# Altium footprint library Connector.PcbLib: 65 footprints (part 3 of 5)
Each footprint in its own frame and in the unit in brackets; x right, y up, seen from the top. Pads: shape width x height; smd on the part's side, far side on the other; paste and mask are expansions set on the pad; w line width, h text height; cw(c..) or ccw(c..) is an arc to the next point about the centre after c.
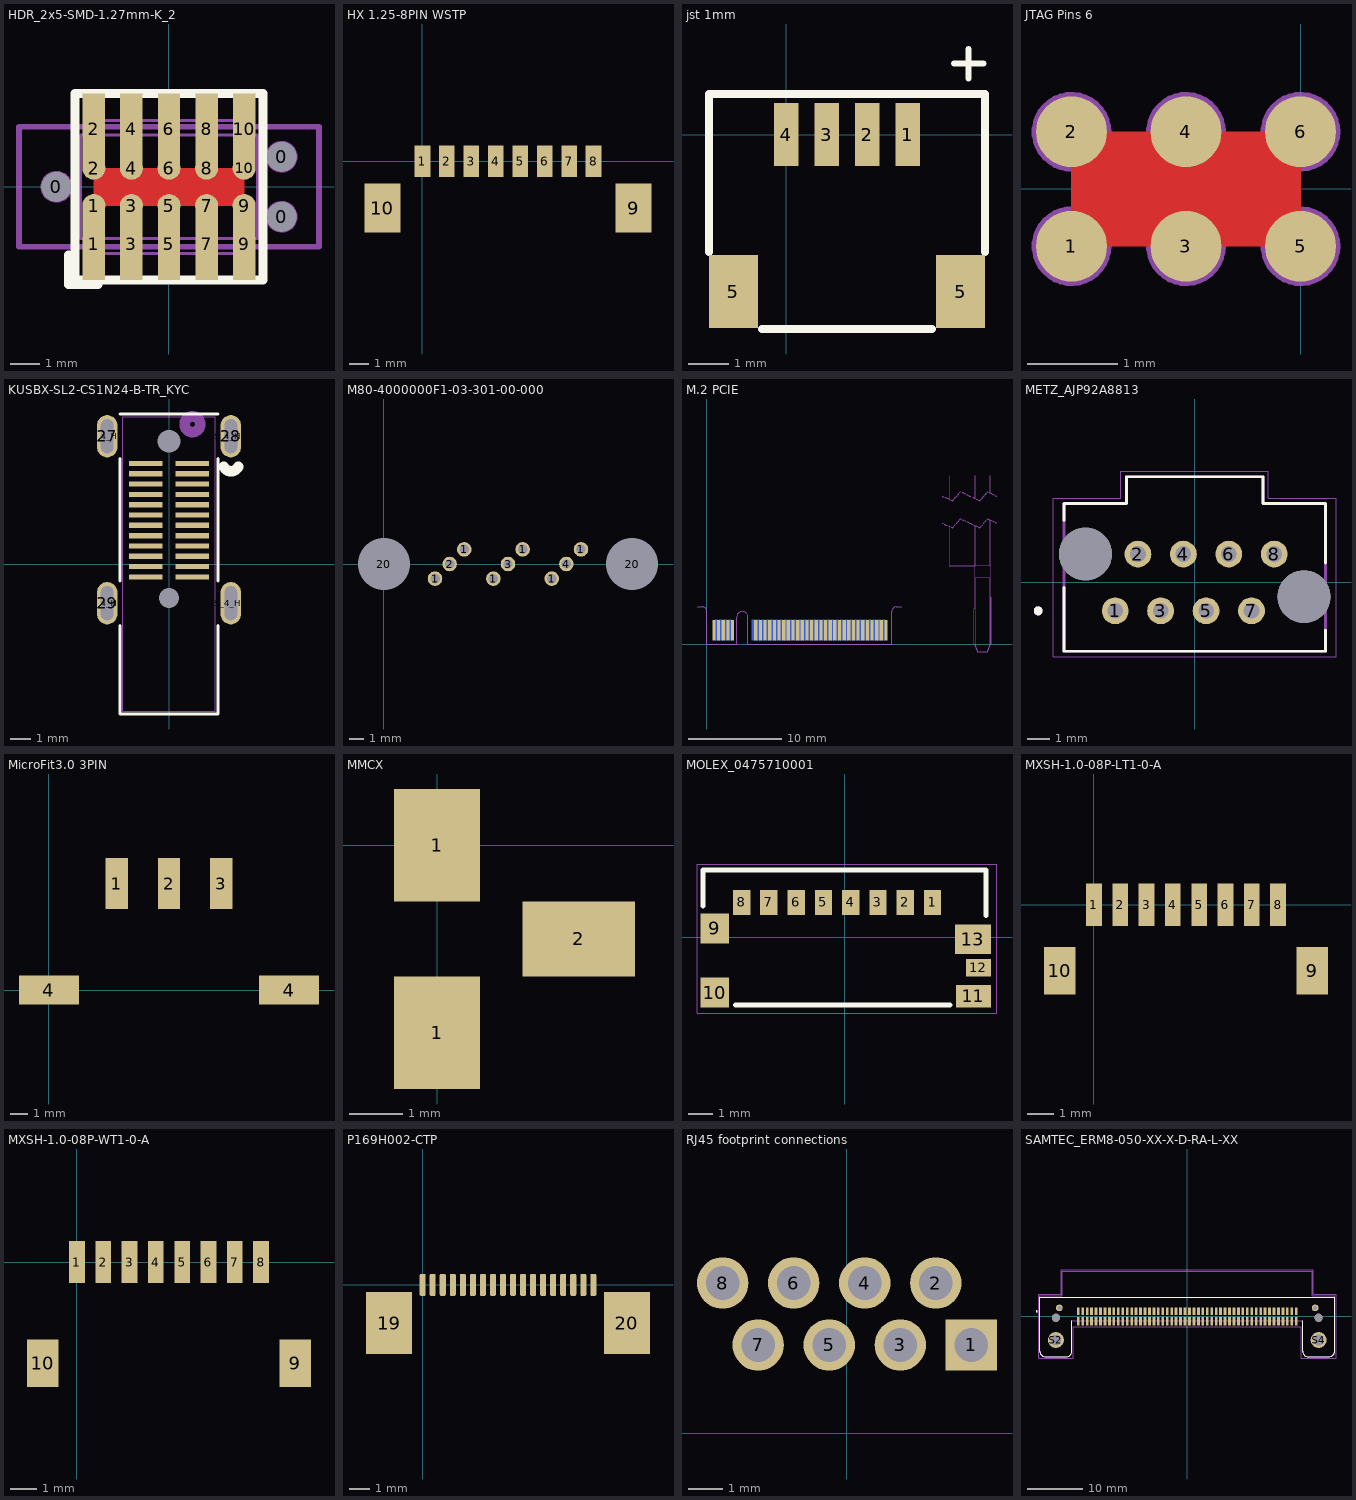
[diagram p2: the footprints below, top view; thin cyan lines are the x and y axes]

## HDR_2x5-SMD-1.27mm-K_2 [mil]
pads (23):
  round 39 hole 39 unplated: 0(-150,0) 0(150,-40) 0(150,40)
  rect 29.92x94.49 smd: 1(-100,-76.77) 2(-100,76.77) 3(-50,-76.77) 4(-50,76.77) 5(0,-76.77) 6(0,76.77) 7(50,-76.77) 8(50,76.77) 9(100,-76.77) 10(100,76.77)
  round 31 smd paste-196.85: 1(-100,-25) 2(-100,25) 3(-50,-25) 4(-50,25) 5(0,-25) 6(0,25) 7(50,-25) 8(50,25) 9(100,-25) 10(100,25)
Top Layer:
  pour cut-out: -100,25 -100,-25 100,-25 100,25
Top Overlay:
  lines w11.81: -133.86,-90.55 -133.86,-129.92 -94.49,-129.92 ; -125,-124.02 125,-124.02 125,124.02 -125,124.02 -125,-124.02
Mechanical 7:
  lines w3.94: -107.87,-68.9 -107.87,-96.79 ccw(c-100,-96.79) -92.13,-96.79 -92.13,-88.58 ; -107.87,68.9 -107.87,96.79 cw(c-100,96.79) -92.13,96.79 -92.13,88.58 ; -98.43,-68.9 -98.43,-88.58 -49.21,-88.58 ; -98.43,68.9 -98.43,88.58 98.43,88.58 98.43,68.9 ; -57.87,-88.58 -57.87,-96.79 ccw(c-50,-96.79) -42.13,-96.79 -42.13,-88.58 ; -57.87,88.58 -57.87,96.79 cw(c-50,96.79) -42.13,96.79 -42.13,88.58 ; -49.21,-68.9 -49.21,-88.58 ; -7.87,-88.58 -7.87,-96.79 ccw(c0,-96.79) 7.87,-96.79 7.87,-88.58 ; -7.87,88.58 -7.87,96.79 cw(c0,96.79) 7.87,96.79 7.87,88.58 ; 42.13,-88.58 42.13,-96.79 ccw(c50,-96.79) 57.87,-96.79 57.87,-88.58 ; 42.13,88.58 42.13,96.79 cw(c50,96.79) 57.87,96.79 57.87,88.58 ; 49.21,-68.9 49.21,-88.58 ; 92.13,-88.58 92.13,-96.79 ccw(c100,-96.79) 107.87,-96.79 107.87,-68.9 ; 92.13,88.58 92.13,96.79 cw(c100,96.79) 107.87,96.79 107.87,68.9 ; 98.43,-68.9 98.43,-88.58 49.21,-88.58 ; -49.21,-88.58 49.21,-88.58 ; -118.11,-68.9 -118.11,68.9 118.11,68.9 118.11,-68.9 -118.11,-68.9 ; -108.27,-32.87 -108.27,-17.13 -92.52,-17.13 -92.52,-32.87 -108.27,-32.87 ; -107.48,17.13 -107.48,32.87 -91.73,32.87 -91.73,17.13 -107.48,17.13 ; -58.27,-32.87 -58.27,-17.13 -42.52,-17.13 -42.52,-32.87 -58.27,-32.87 ; -57.48,17.13 -57.48,32.87 -41.73,32.87 -41.73,17.13 -57.48,17.13 ; -8.27,-32.87 -8.27,-17.13 7.48,-17.13 7.48,-32.87 -8.27,-32.87 ; -7.48,17.13 -7.48,32.87 8.27,32.87 8.27,17.13 -7.48,17.13 ; 41.73,-32.87 41.73,-17.13 57.48,-17.13 57.48,-32.87 41.73,-32.87 ; 42.52,17.13 42.52,32.87 58.27,32.87 58.27,17.13 42.52,17.13 ; 91.73,-32.87 91.73,-17.13 107.48,-17.13 107.48,-32.87 91.73,-32.87 ; 92.52,17.13 92.52,32.87 108.27,32.87 108.27,17.13 92.52,17.13
Mechanical 8:
  circle w3.94: c150,-39.98 r19.26
  circle w3.94: c150,39.98 r19.26
  circle w3.94: c-150,0 r19.26
Mechanical 15:
  lines w7.87: -199.8,-79.92 199.8,-79.92 199.8,79.92 -199.8,79.92 -199.8,-79.92
3D body "Samtec-FTSH-105-01-F-DV-K.step": height 240.75, standoff -0.25, extent -123.49,-114.99 123.51,115

## HX 1.25-8PIN WSTP [mm] "https://www.lcsc.com/product-detail/Wire-To-Board-Connector_hanxia-HX-1-25-8PIN-WSTP_C19270006.html?s_z=n_jst%208pin"
pads (10):
  rect 0.8x1.6 smd: 1(0,0) 2(1.25,0) 3(2.5,0) 4(3.75,0) 5(5,0) 6(6.25,0) 7(7.5,0) 8(8.75,0)
  rect 1.85x2.5 smd: 9(10.8,-2.4) 10(-2.05,-2.4)
3D body: height 3.55, standoff 0, extent -3.1,-5.25 11.9,0.75

## jst 1mm [mm]
pads (6):
  rect 0.6x1.55 smd: 1(3,0) 2(2,0) 3(1,0) 4(0,0)
  rect 1.2x1.8 smd: 5(-1.3,-3.875) 5(4.3,-3.875)
Top Overlay:
  lines w0.15: 4.135,1.75 4.865,1.75 ; 4.5,1.385 4.5,2.115
  lines w0.2: -1.9,-2.9 -1.9,1 4.9,1 4.9,-2.9 ; -0.6,-4.8 3.6,-4.8
3D body "SM04B-SRSS-TB.STEP": height 2.96, standoff 0, extent -1.476,-4.657 4.524,0.293

## JTAG Pins 6 [mil] "TC2030-ALT-NL"
pads (6):
  round 31 smd paste-196.85: 1(-100,-25) 2(-100,25) 3(-50,-25) 4(-50,25) 5(0,-25) 6(0,25)
Top Layer:
  pour cut-out: -100,25 -100,-25 0,-25 0,25
Mechanical 7:
  circle w3.94: c-100,24.99 r15.45
  circle w3.94: c-100,-24.99 r15.45
  circle w3.94: c-50,-24.99 r15.45
  circle w3.94: c0,-24.99 r15.45
  circle w3.94: c0,24.99 r15.45
  circle w3.94: c-50,24.99 r15.45
  text ".Designator" at -118.11,0 h15

## KUSBX-SL2-CS1N24-B-TR_KYC [mil]
pads (33):
  round 0 hole 43 unplated: 25(0,234.26)
  round 0 hole 39 unplated paste-99999 mask-19.5: 26(0,-64.96)
  oval 39x81 smd paste-40.5 mask-40.5: 27(-118.11,244.1) 28(118.11,244.1) 29(-118.11,-74.8)
  rect 64x10 smd paste+0 mask+0: A1(44.78,191.93) A2(44.78,172.25) A3(44.78,152.56) A4(44.78,132.88) A5(44.78,113.19) A6(44.78,93.51) A7(44.78,73.82) A8(44.78,54.14) A9(44.78,34.45) A10(44.78,14.77) A11(44.78,-4.92) A12(44.78,-24.6) B1(-44.78,-24.6) B2(-44.78,-4.92) B3(-44.78,14.77) B4(-44.78,34.45) B5(-44.78,54.14) B6(-44.78,73.82) B7(-44.78,93.51) B8(-44.78,113.19) B9(-44.78,132.88) B10(-44.78,152.56) B11(-44.78,172.25) B12(-44.78,191.93)
  oval 39.02x80.98 hole 24.02 slot 65 at 90 deg unplated: S_4_H1(-118.11,244.1) S_4_H1(-118.11,-74.8) S_4_H1(118.11,-74.8) S_4_H1(118.11,244.1)
Top Overlay:
  lines w6: -93.5,-117.18 -93.5,-286.5 93.5,-286.5 93.5,-117.18 ; -93.5,-32.42 -93.5,201.72 ; -93.5,286.5 93.5,286.5 ; 93.5,-32.42 93.5,201.72
  lines w20: 104.81,185.8 ccw(c118.5,191.93) 132.34,186.14
Bottom Overlay:
  lines w20: 105.16,185.08 ccw(c118.5,191.93) 132.33,186.12
Mechanical 13:
  circle w20: c44.78,266.93 r15
  lines w1: -88.5,-281.5 -88.5,281.5 88.5,281.5 88.5,-281.5 -88.5,-281.5
Multi-Layer:
  lines w24: 118.11,-95.3 118.11,-54.3
3D body "KUSBX-SL2-CS1N24-B_A (1).STEP": height 386.61, standoff -67.32, extent -124.12,-281.92 123.91,281.07

## M80-4000000F1-03-301-00-000 [mm] "Datamate harwin coax 3"
pads (11):
  round 1 hole 0.65: 1(3.5,-1) 1(5.5,1) 1(7.5,-1) 1(9.5,1) 1(11.5,-1) 1(13.5,1) 2(4.5,0) 3(8.5,0) 4(12.5,0)
  round 1.2 hole 3.55 unplated: 20(0,0) 20(17,0)
3D body "m80-4000000f1-03-301-00-000_asm.stp": height 5.5, standoff -3, extent -2.5,-2.775 19.5,2.775

## M.2 PCIE [mm]
pads (67):
  rect 0.35x2.2 smd paste-2539.97 mask-0.305: 1(19.25,1.5) 3(18.75,1.5) 5(18.25,1.5) 7(17.75,1.5) 9(17.25,1.5) 11(16.75,1.5) 13(16.25,1.5) 15(15.75,1.5) 17(15.25,1.5) 19(14.75,1.5) 21(14.25,1.5) 23(13.75,1.5) 25(13.25,1.5) 27(12.75,1.5) 29(12.25,1.5) 31(11.75,1.5) 33(11.25,1.5) 35(10.75,1.5) 37(10.25,1.5) 39(9.75,1.5) 41(9.25,1.5) 43(8.75,1.5) 45(8.25,1.5) 47(7.75,1.5) 49(7.25,1.5) 51(6.75,1.5) 53(6.25,1.5) 55(5.75,1.5) 57(5.25,1.5) 67(2.75,1.5) 69(2.25,1.5) 71(1.75,1.5) 73(1.25,1.5) 75(0.75,1.5)
  rect 0.35x2.2 smd far side paste-2539.97 mask-0.305: 2(19,1.5) 4(18.5,1.5) 6(18,1.5) 8(17.5,1.5) 10(17,1.5) 12(16.5,1.5) 14(16,1.5) 16(15.5,1.5) 18(15,1.5) 20(14.5,1.5) 22(14,1.5) 24(13.5,1.5) 26(13,1.5) 28(12.5,1.5) 30(12,1.5) 32(11.5,1.5) 34(11,1.5) 36(10.5,1.5) 38(10,1.5) 40(9.5,1.5) 42(9,1.5) 44(8.5,1.5) 46(8,1.5) 48(7.5,1.5) 50(7,1.5) 52(6.5,1.5) 54(6,1.5) 56(5.5,1.5) 58(5,1.5) 68(2.5,1.5) 70(2,1.5) 72(1.5,1.5) 74(1,1.5)
Top Solder:
  rectangle: 0,0 20,4
Bottom Solder:
  rectangle: 0,0 20,4
Mechanical 1:
  drawing of 115 lines, arcs and shapes, not listed
  text "Chamfer edge" at 31.8,1.133 h1

## METZ_AJP92A8813 [mm]
height 11
pads (10):
  round 1.2 hole 0.7: 1(-3.556,-1.27) 2(-2.54,1.27) 3(-1.524,-1.27) 4(-0.508,1.27) 5(0.508,-1.27) 6(1.524,1.27) 7(2.54,-1.27) 8(3.556,1.27)
  round 2.36 hole 2.36 unplated: ""(-4.89,1.27) ""(4.89,-0.635)
Top Overlay:
  circle w0.2: c-7,-1.27 r0.1
  lines w0.127: -5.85,-0.23 -5.85,-3.075 5.85,-3.075 5.85,-2.135 ; -5.85,2.77 -5.85,3.525 -3.05,3.525 -3.05,4.725 3.05,4.725 3.05,3.525 5.85,3.525 5.85,0.865
Mechanical 13:
  circle w0.2: c-7,-1.27 r0.1
  lines w0.127: -5.85,-3.075 -5.85,3.525 -3.05,3.525 -3.05,4.725 3.05,4.725 3.05,3.525 5.85,3.525 5.85,-3.075 -5.85,-3.075
Mechanical 15:
  lines w0.05: -6.32,-3.325 -6.32,3.775 -3.3,3.775 -3.3,4.975 3.3,4.975 3.3,3.775 6.32,3.775 6.32,-3.325 -6.32,-3.325
3D body "step_temp.STEP": height 11, standoff -3.3, extent -5.85,-3.075 5.85,4.725

## MicroFit3.0 3PIN [mm]
pads (5):
  rect 1.27x2.92 smd: 1(3.885,6.105) 2(6.885,6.105) 3(9.885,6.105)
  rect 3.43x1.65 smd: 4(0,0) 4(13.77,0)
3D body "436500314.stp": height 5.64, standoff -0.04, extent -1.525,-4.65 15.125,6.09

## MMCX [mm]
pads (3):
  rect 1.6x2.1 smd: 1(0,-3.5) 1(0,0)
  rect 2.1x1.4 smd: 2(2.65,-1.75)
3D body "HUBER+SUHNER 85_MMCX-S50-0-55119_OM 3DModel.stp": height 4.9, standoff 0, extent -1.835,-4.191 3.175,0.709

## MOLEX_0475710001 [mm]
pads (13):
  rect 0.7x1 smd: 1(3.55,1.415) 2(2.45,1.415) 3(1.35,1.415) 4(0.25,1.415) 5(-0.85,1.415) 6(-1.95,1.415) 7(-3.05,1.415) 8(-4.15,1.415)
  rect 1.15x1.2 smd: 9(-5.225,0.365) 10(-5.225,-2.225)
  rect 1.4x0.9 smd: 11(5.2,-2.375)
  rect 1x0.7 smd: 12(5.4,-1.225)
  rect 1.45x1.2 smd: 13(5.175,-0.075)
Top Overlay:
  lines w0.2: -5.7,1.275 -5.7,2.725 5.7,2.725 5.7,0.875 ; -4.4,-2.725 4.25,-2.725
Mechanical 16:
  lines w0.05: -5.95,-3.05 6.15,-3.05 6.15,2.95 -5.95,2.95 -5.95,-3.05
3D body "475710001.stp": height 2.31, standoff 0.01, extent -5.685,-2.598 5.715,2.852

## MXSH-1.0-08P-LT1-0-A [mm] "1mm 8 pin Vertical connector"
pads (10):
  rect 0.6x1.6 smd: 1(0,0) 2(1,0) 3(2,0) 4(3,0) 5(4,0) 6(5,0) 7(6,0) 8(7,0)
  rect 1.2x1.8 smd: 9(8.3,-2.5) 10(-1.3,-2.5)
3D body: height 4.5, standoff 0, extent -1.625,-3.3 8.625,-0.2

## MXSH-1.0-08P-WT1-0-A [mm] "1mm 8 pin horisontal connector"
pads (10):
  rect 0.6x1.6 smd: 1(0,0) 2(1,0) 3(2,0) 4(3,0) 5(4,0) 6(5,0) 7(6,0) 8(7,0)
  rect 1.2x1.8 smd: 9(8.3,-3.85) 10(-1.3,-3.85)
3D body: height 3, standoff 0, extent -1.566,-4.744 8.684,0.306

## P169H002-CTP [mm] "FPC Connector and display"
pads (20):
  rrect50% 0.3x1.1 smd: 1(8.5,0) 2(8,0) 3(7.5,0) 4(7,0) 5(6.5,0) 6(6,0) 7(5.5,0) 8(5,0) 9(4.5,0) 10(4,0) 11(3.5,0) 12(3,0) 13(2.5,0) 14(2,0) 15(1.5,0) 16(1,0) 17(0.5,0) 18(0,0)
  rect 2.3x3.1 smd: 19(-1.67,-1.9) 20(10.17,-1.9)
3D body "PRD-300-00002 - 3D Bent.STEP": height 5.91, standoff 1.32, extent -12.375,-24.899 20.875,16.349
3D body "c-1-1734839-8-c-3d.stp": height 2.2, standoff 0.15, extent -2.965,-4.86 11.465,0.25

## RJ45 footprint connections [mm]
pads (8):
  rect 1.478x1.478 hole 0.97: 1(3.58,2.54)
  round 1.478 hole 0.97: 2(2.56,4.32) 3(1.54,2.54) 4(0.52,4.32) 5(-0.5,2.54) 6(-1.52,4.32) 7(-2.54,2.54) 8(-3.56,4.32)

## SAMTEC_ERM8-050-XX-X-D-RA-L-XX [mm]
pads (106):
  rect 0.5x1.3 smd: 01(-19.6,0.84) 03(-18.8,0.84) 05(-18,0.84) 07(-17.2,0.84) 09(-16.4,0.84) 11(-15.6,0.84) 13(-14.8,0.84) 15(-14,0.84) 17(-13.2,0.84) 19(-12.4,0.84) 21(-11.6,0.84) 23(-10.8,0.84) 25(-10,0.84) 27(-9.2,0.84) 29(-8.4,0.84) 31(-7.6,0.84) 33(-6.8,0.84) 35(-6,0.84) 37(-5.2,0.84) 39(-4.4,0.84) 41(-3.6,0.84) 43(-2.8,0.84) 45(-2,0.84) 47(-1.2,0.84) 49(-0.4,0.84) 51(0.4,0.84) 53(1.2,0.84) 55(2,0.84) 57(2.8,0.84) 59(3.6,0.84) 61(4.4,0.84) 63(5.2,0.84) 65(6,0.84) 67(6.8,0.84) 69(7.6,0.84) 71(8.4,0.84) 73(9.2,0.84) 75(10,0.84) 77(10.8,0.84) 79(11.6,0.84) 81(12.4,0.84) 83(13.2,0.84) 85(14,0.84) 87(14.8,0.84) 89(15.6,0.84) 91(16.4,0.84) 93(17.2,0.84) 95(18,0.84) 97(18.8,0.84) 99(19.6,0.84)
  rect 0.5x1.52 smd: 02(-19.6,-0.95) 04(-18.8,-0.95) 06(-18,-0.95) 08(-17.2,-0.95) 10(-16.4,-0.95) 12(-15.6,-0.95) 14(-14.8,-0.95) 16(-14,-0.95) 18(-13.2,-0.95) 20(-12.4,-0.95) 22(-11.6,-0.95) 24(-10.8,-0.95) 26(-10,-0.95) 28(-9.2,-0.95) 30(-8.4,-0.95) 32(-7.6,-0.95) 34(-6.8,-0.95) 36(-6,-0.95) 38(-5.2,-0.95) 40(-4.4,-0.95) 42(-3.6,-0.95) 44(-2.8,-0.95) 46(-2,-0.95) 48(-1.2,-0.95) 50(-0.4,-0.95) 52(0.4,-0.95) 54(1.2,-0.95) 56(2,-0.95) 58(2.8,-0.95) 60(3.6,-0.95) 62(4.4,-0.95) 64(5.2,-0.95) 66(6,-0.95) 68(6.8,-0.95) 70(7.6,-0.95) 72(8.4,-0.95) 74(9.2,-0.95) 76(10,-0.95) 78(10.8,-0.95) 80(11.6,-0.95) 82(12.4,-0.95) 84(13.2,-0.95) 86(14,-0.95) 88(14.8,-0.95) 90(15.6,-0.95) 92(16.4,-0.95) 94(17.2,-0.95) 96(18,-0.95) 98(18.8,-0.95) 100(19.6,-0.95)
  round 1.208 hole 0.7: S1(-23,1.46) S3(23,1.46)
  round 2.865 hole 1.91: S2(-23.625,-4.32) S4(23.625,-4.32)
  round 1.45 hole 1.45 unplated: ""(-23.625,-0.32) ""(23.625,-0.32)
Top Overlay:
  circle w0.2: c-27.1,0.84 r0.1
  lines w0.2: -20.75,-0.85 -20.75,-6.32 cw(c-21.75,-6.32) -21.75,-7.32 -25.5,-7.32 cw(c-25.5,-6.32) -26.5,-6.32 -26.5,3.38 26.5,3.38 26.5,-6.32 cw(c25.5,-6.32) 25.5,-7.32 21.75,-7.32 cw(c21.75,-6.32) 20.75,-6.32 20.75,-0.85
Top Paste:
  circle w0.965: c-23,1.46 r0.483
  circle w0.965: c23,1.46 r0.483
  circle w1.205: c-23.625,-4.32 r0.603
  circle w1.205: c23.625,-4.32 r0.603
Mechanical 13:
  circle w0.2: c-27.1,0.84 r0.1
  lines w0.1: -26.5,3.38 -26.5,-6.32 ccw(c-25.5,-6.32) -25.5,-7.32 -21.75,-7.32 ccw(c-21.75,-6.32) -20.75,-6.32 -20.75,-0.85 20.75,-0.85 20.75,-6.32 ccw(c21.75,-6.32) 21.75,-7.32 25.5,-7.32 ccw(c25.5,-6.32) 26.5,-6.32 26.5,3.38 ; -26.5,3.38 -26.5,3.68 -22.45,3.68 -22.45,8.04 22.45,8.04 22.45,3.68 26.5,3.68 26.5,3.38 ; -26.5,3.38 26.5,3.38
  text "PCB EDGE" at -4.5,3.88 h1.27
Mechanical 15:
  lines w0.05: -26.75,-7.57 -20.5,-7.57 -20.5,-1.96 20.5,-1.96 20.5,-7.57 26.75,-7.57 26.75,3.93 22.7,3.93 22.7,8.29 -22.7,8.29 -22.7,3.93 -26.75,3.93 -26.75,-7.57
3D body "ERM8-050-01-L-D-RA-L-TR.stp": height 6.35, standoff -1.58, extent -26.5,-7.3 26.5,8.06